# Altium footprint library Connectors.PcbLib: 79 footprints (part 2 of 5)
Each footprint in its own frame and in the unit in brackets; x right, y up, seen from the top. Pads: shape width x height; smd on the part's side, far side on the other; paste and mask are expansions set on the pad; w line width, h text height; cw(c..) or ccw(c..) is an arc to the next point about the centre after c.
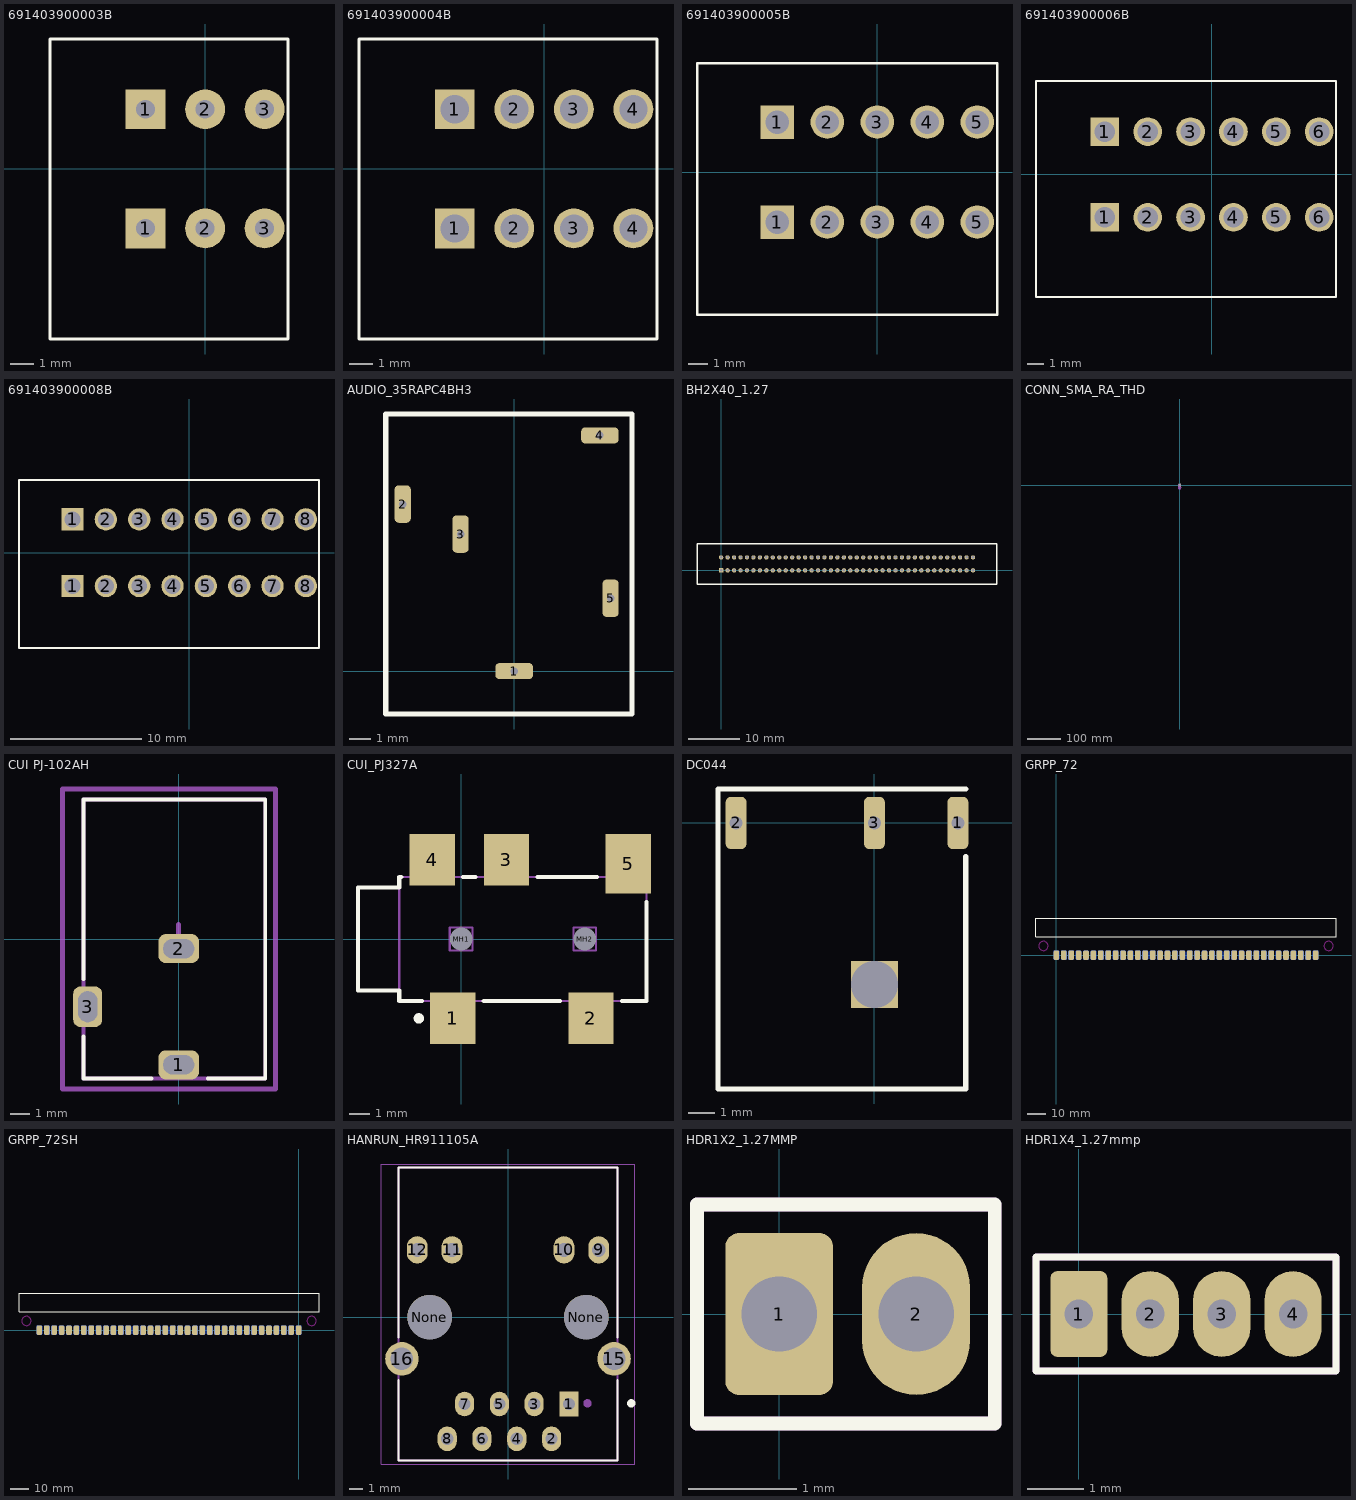
[diagram p1: the footprints below, top view; thin cyan lines are the x and y axes]

## 691403900003B [mm] "2,54mm - Spring clamp/Screwless - Vertical wire entry - 03p"
height 13.6
pads (6):
  rect 1.7x1.7 hole 0.8: 1(-2.54,2.54) 1(-2.54,-2.54)
  round 1.7 hole 0.8: 2(0,-2.54) 2(0,2.54) 3(2.54,-2.54) 3(2.54,2.54)
Top Overlay:
  lines w0.127: -6.62,-7.26 3.54,-7.26 3.54,5.54 -6.62,5.54 -6.62,-7.26
3D body "691403900003B.stp": height 13.61, standoff -3.49, extent -6.62,-7.26 3.54,5.54

## 691403900004B [mm] "2,54mm - Spring clamp/Screwless - Vertical wire entry - 04p"
height 13.6
pads (8):
  rect 1.7x1.7 hole 1.2: 1(-3.81,-2.54) 1(-3.81,2.54)
  round 1.7 hole 1.2: 2(-1.27,-2.54) 2(-1.27,2.54) 3(1.27,-2.54) 3(1.27,2.54) 4(3.81,-2.54) 4(3.81,2.54)
Top Overlay:
  lines w0.127: -7.89,-7.26 -7.89,5.54 4.81,5.54 4.81,-7.26 -7.89,-7.26
3D body "691403900004B.stp": height 13.61, standoff -3.49, extent -7.89,-7.26 4.81,5.54

## 691403900005B [mm] "2,54mm - Spring clamp/Screwless - Vertical wire entry - 05p"
height 13.6
pads (10):
  rect 1.7x1.7 hole 1.2: 1(-5.08,-2.54) 1(-5.08,2.54)
  round 1.7 hole 1.2: 2(-2.54,-2.54) 2(-2.54,2.54) 3(0,-2.54) 3(0,2.54) 4(2.54,-2.54) 4(2.54,2.54) 5(5.08,-2.54) 5(5.08,2.54)
Top Overlay:
  lines w0.127: -9.16,-7.26 -9.16,5.54 6.08,5.54 6.08,-7.26 -9.16,-7.26
3D body "691403900005B.stp": height 13.61, standoff -3.49, extent -9.16,-7.26 6.08,5.54

## 691403900006B [mm] "2,54mm - Spring clamp/Screwless - Vertical wire entry - 06p"
height 13.6
pads (12):
  rect 1.7x1.7 hole 1.2: 1(-6.35,-2.54) 1(-6.35,2.54)
  round 1.7 hole 1.2: 2(-3.81,-2.54) 2(-3.81,2.54) 3(-1.27,-2.54) 3(-1.27,2.54) 4(1.27,-2.54) 4(1.27,2.54) 5(3.81,-2.54) 5(3.81,2.54) 6(6.35,-2.54) 6(6.35,2.54)
Top Overlay:
  lines w0.127: -10.43,-7.26 7.35,-7.26 7.35,5.54 -10.43,5.54 -10.43,-7.26
3D body "691403900006B.stp": height 13.61, standoff -3.49, extent -10.43,-7.26 7.35,5.54

## 691403900008B [mm] "2,54mm - Spring clamp/Screwless - Vertical wire entry - 08p"
height 13.6
pads (16):
  rect 1.7x1.7 hole 1.2: 1(-8.89,-2.54) 1(-8.89,2.54)
  round 1.7 hole 1.2: 2(-6.35,-2.54) 2(-6.35,2.54) 3(-3.81,-2.54) 3(-3.81,2.54) 4(-1.27,-2.54) 4(-1.27,2.54) 5(1.27,-2.54) 5(1.27,2.54) 6(3.81,-2.54) 6(3.81,2.54) 7(6.35,-2.54) 7(6.35,2.54) 8(8.89,-2.54) 8(8.89,2.54)
Top Overlay:
  lines w0.127: -12.97,-7.26 -12.97,5.54 9.89,5.54 9.89,-7.26 -12.97,-7.26
3D body "691403900008B.stp": height 13.61, standoff -3.49, extent -12.97,-7.26 9.89,5.54

## AUDIO_35RAPC4BH3 [mm] "Switchcraft Phone Connectors 3.5MM STEREO JACK"
pads (5):
  rrect50% 1.75x0.75 hole 0.35 square: 1(0,0) 4(4,11)
  rrect50% 0.75x1.75 hole 0.35 square: 2(-5.2,7.8) 3(-2.5,6.4) 5(4.5,3.4)
Top Overlay:
  lines w0.254: -6,-2 -6,12 5.5,12 5.5,-2 -6,-2
3D body "SJ1-3513N.stp": height 6, standoff -3, extent -5.9,-5.5 5.6,12

## BH2X40_1.27 [mm]
pads (80):
  rrect20% 0.85x0.85 hole 0.5: 1(0,0)
  round 0.85 hole 0.5: 2(0,2.54) 3(1.27,0) 4(1.27,2.54) 5(2.54,0) 6(2.54,2.54) 7(3.81,0) 8(3.81,2.54) 9(5.08,0) 10(5.08,2.54) 11(6.35,0) 12(6.35,2.54) 13(7.62,0) 14(7.62,2.54) 15(8.89,0) 16(8.89,2.54) 17(10.16,0) 18(10.16,2.54) 19(11.43,0) 20(11.43,2.54) 21(12.7,0) 22(12.7,2.54) 23(13.97,0) 24(13.97,2.54) 25(15.24,0) 26(15.24,2.54) 27(16.51,0) 28(16.51,2.54) 29(17.78,0) 30(17.78,2.54) 31(19.05,0) 32(19.05,2.54) 33(20.32,0) 34(20.32,2.54) 35(21.59,0) 36(21.59,2.54) 37(22.86,0) 38(22.86,2.54) 39(24.13,0) 40(24.13,2.54) 41(25.4,0) 42(25.4,2.54) 43(26.67,0) 44(26.67,2.54) 45(27.94,0) 46(27.94,2.54) 47(29.21,0) 48(29.21,2.54) 49(30.48,0) 50(30.48,2.54) 51(31.75,0) 52(31.75,2.54) 53(33.02,0) 54(33.02,2.54) 55(34.29,0) 56(34.29,2.54) 57(35.56,0) 58(35.56,2.54) 59(36.83,0) 60(36.83,2.54) 61(38.1,0) 62(38.1,2.54) 63(39.37,0) 64(39.37,2.54) 65(40.64,0) 66(40.64,2.54) 67(41.91,0) 68(41.91,2.54) 69(43.18,0) 70(43.18,2.54) 71(44.45,0) 72(44.45,2.54) 73(45.72,0) 74(45.72,2.54) 75(46.99,0) 76(46.99,2.54) 77(48.26,0) 78(48.26,2.54) 79(49.53,0) 80(49.53,2.54)
Top Overlay:
  lines w0.254: -4.75,-2.75 -4.75,5.25 54.25,5.25 54.25,-2.75 -4.75,-2.75

## CONN_SMA_RA_THD [mm]
height 10.43
pads (5):
  round 2.5 hole 1.5: 1(0,0)
  round 2.5 hole 1.6: 2(-2.54,-2.54) 2(-2.54,2.54) 2(2.54,-2.54) 2(2.54,2.54)
Mechanical 13:
  drawing of 402 lines, arcs and shapes, not listed
3D body "SMA Conn TE 5-1814400-1.STEP": height 10.43, standoff -3.41, extent -3.173,-11.05 3.167,3.15

## CUI PJ-102AH [mm] "DC Barrel Jack W/ Switch 2.0x5.5"
height 11
pads (3):
  rrect50% 2.1x1.5 hole 1 slot 1.6 at 0 deg: 1(0,-6.5) 2(0,-0.5)
  rrect50% 1.5x2.1 hole 1 slot 1.6 at 90 deg: 3(-4.7,-3.5)
Top Overlay:
  lines w0.2: -4.925,-5.025 -4.925,-7.2 -1.4,-7.2 ; -4.925,-2.075 -4.925,7.2 4.475,7.2 4.475,-6.525 4.475,-7.2 1.5,-7.2
Mechanical 1:
  lines w0.2: -4.925,-7.2 -4.925,7.2 4.475,7.2 4.475,-7.2 -4.925,-7.2
Mechanical 15:
  lines w0.254: -0.75,0 0,0 ; 0,-0.75 0,0 ; 0,0.75 0,0 ; 0.75,0 0,0 ; -6,-7.75 -6,-3.5 -6,7.75 5,7.75 5,-7.75 -6,-7.75
3D body "CUI-PJ-102AH.step": height 11, standoff -3.5, extent -4.925,-7.2 4.475,7.2

## CUI_PJ327A [mm] "Phone Jack, Right Angle, SM, Body 14x6x4.8mm (LxWxH)"
height 4.87
pads (7):
  rect 2.2x2.5 smd: 1(-0.4,-3.85) 2(6.3,-3.85) 3(2.2,3.85) 4(-1.4,3.85)
  rect 2.2x2.9 smd: 5(8.1,3.65)
  round 0.8 hole 1.1 unplated: MH1(0,0) MH2(6,0)
Top Overlay:
  circle w0.25: c-2.05,-3.85 r0.125
  lines w0.2: -2.9,3 -3,3 -3,2.5 -5,2.5 -5,-2.5 -3,-2.5 -3,-3 -1.9,-3 ; 0.1,3 0.7,3 ; 1.1,-3 4.8,-3 ; 3.7,3 6.6,3 ; 7.8,-3 9,-3 9,1.8
Mechanical 13:
  lines w0.1: -3,-2.5 -5,-2.5 -5,2.5 -3,2.5 ; -3,-3 -3,3 9,3 9,-3 -3,-3 ; -0.55,-0.55 -0.55,0.55 0.55,0.55 0.55,-0.55 -0.55,-0.55 ; 5.45,-0.55 6.55,-0.55 6.55,0.55 5.45,0.55 5.45,-0.55
3D body "User Library-Micro_Jack_3_5mmTRS.STEP": height 6.3, standoff -1.7, extent -73.3,-4 8.6,4
3D body: height 0.1, standoff -0.4, extent 5.451,-0.549 6.549,0.549
3D body: height 0.1, standoff -0.4, extent -0.549,-0.549 0.549,0.549
3D body: height 4.8, standoff -0.2, extent -4.999,-2.497 -2.999,2.497
3D body: height 4.77, standoff 0, extent -2.999,-2.999 9,3

## DC044 [mm]
pads (4):
  rrect50% 0.8x2 hole 0.5 square: 1(3.2,0) 2(-5.3,0) 3(0,0)
  rect 1.8x1.8 hole 1.8 square unplated: ""(0,-6.2)
Top Overlay:
  lines w0.2: 3.5,-1.3 3.5,-10.2 3.2,-10.2 -6,-10.2 -6,1.3 3.5,1.3
3D body "DC044 (2).step": height 7, standoff -2.7, extent -6.05,-10.2 3.45,1.3

## GRPP_72 [mm] "Разъем ГРПП-72"
pads (72):
  rrect50% 3x5 smd: 1(0,0) 2(4,0) 3(8,0) 4(12,0) 5(16,0) 6(20,0) 7(24,0) 8(28,0) 9(32,0) 10(36,0) 11(40,0) 12(44,0) 13(48,0) 14(52,0) 15(56,0) 16(60,0) 17(64,0) 18(68,0) 19(72,0) 20(76,0) 21(80,0) 22(84,0) 23(88,0) 24(92,0) 25(96,0) 26(100,0) 27(104,0) 28(108,0) 29(112,0) 30(116,0) 31(120,0) 32(124,0) 33(128,0) 34(132,0) 35(136,0) 36(140,0)
  rrect50% 3x5 smd far side: 37(0,0) 38(4,0) 39(8,0) 40(12,0) 41(16,0) 42(20,0) 43(24,0) 44(28,0) 45(32,0) 46(36,0) 47(40,0) 48(44,0) 49(48,0) 50(52,0) 51(56,0) 52(60,0) 53(64,0) 54(68,0) 55(72,0) 56(76,0) 57(80,0) 58(84,0) 59(88,0) 60(92,0) 61(96,0) 62(100,0) 63(104,0) 64(108,0) 65(112,0) 66(116,0) 67(120,0) 68(124,0) 69(128,0) 70(132,0) 71(136,0) 72(140,0)
Top Overlay:
  lines w0.254: -11,10 -11,20 151,20 151,10 -11,10
Keep-Out Layer:
  circle w0.254: c-7,5 r2.5
  circle w0.254: c147,5 r2.5

## GRPP_72SH [mm] "Разъем ГРПП-72Ш"
pads (72):
  rrect50% 3x5 smd: 1(0,0) 2(-4,0) 3(-8,0) 4(-12,0) 5(-16,0) 6(-20,0) 7(-24,0) 8(-28,0) 9(-32,0) 10(-36,0) 11(-40,0) 12(-44,0) 13(-48,0) 14(-52,0) 15(-56,0) 16(-60,0) 17(-64,0) 18(-68,0) 19(-72,0) 20(-76,0) 21(-80,0) 22(-84,0) 23(-88,0) 24(-92,0) 25(-96,0) 26(-100,0) 27(-104,0) 28(-108,0) 29(-112,0) 30(-116,0) 31(-120,0) 32(-124,0) 33(-128,0) 34(-132,0) 35(-136,0) 36(-140,0)
  rrect50% 3x5 smd far side: 37(0,0) 38(-4,0) 39(-8,0) 40(-12,0) 41(-16,0) 42(-20,0) 43(-24,0) 44(-28,0) 45(-32,0) 46(-36,0) 47(-40,0) 48(-44,0) 49(-48,0) 50(-52,0) 51(-56,0) 52(-60,0) 53(-64,0) 54(-68,0) 55(-72,0) 56(-76,0) 57(-80,0) 58(-84,0) 59(-88,0) 60(-92,0) 61(-96,0) 62(-100,0) 63(-104,0) 64(-108,0) 65(-112,0) 66(-116,0) 67(-120,0) 68(-124,0) 69(-128,0) 70(-132,0) 71(-136,0) 72(-140,0)
Top Overlay:
  lines w0.254: -151,10 11,10 11,20 -151,20 -151,10
Keep-Out Layer:
  circle w0.254: c7,5 r2.5
  circle w0.254: c-147,5 r2.5

## HANRUN_HR911105A [mm]
pads (16):
  rect 1.398x1.8 hole 0.89: 1(4.45,-6.35)
  oval 1.398x1.8 hole 0.89: 2(3.18,-8.89) 3(1.91,-6.35) 4(0.64,-8.89) 5(-0.63,-6.35) 6(-1.9,-8.89) 7(-3.17,-6.35) 8(-4.44,-8.89)
  oval 1.53x2 hole 1.02: 9(6.625,4.9) 10(4.085,4.9) 11(-4.085,4.9) 12(-6.625,4.9)
  round 2.445 hole 1.63: 15(7.745,-3.05) 16(-7.745,-3.05)
  round 3.25 hole 3.25 unplated: None(-5.715,0) None(5.715,0)
Top Overlay:
  circle w0.3: c9,-6.3 r0.15
  lines w0.127: -8,-4.6 -8,-10.48 8,-10.48 8,-4.6 ; -8,-1.5 -8,10.92 8,10.92 8,-1.5
Mechanical 1:
  circle w0.3: c5.8,-6.3 r0.15
  lines w0.127: -8,-10.48 -8,10.92 8,10.92 8,-10.48 -8,-10.48
Mechanical 4:
  lines w0.05: -9.25,-10.73 -9.25,11.17 9.25,11.17 9.25,-10.73 -9.25,-10.73
3D body "User Library-HR911105A.step": height 13.5, standoff -3, extent -7.93,-10.5 7.95,10.9

## HDR1X2_1.27MMP [mm] "Connector; Header; 2 Position, 0.050\" pitch"
pads (2):
  rrect25% 1x1.5 hole 0.7: 1(0,0)
  oval 1x1.5 hole 0.7: 2(1.27,0)
Top Overlay:
  lines w0.127: -0.762,-1.016 -0.762,1.016 2,1.016 2,-1.016 -0.762,-1.016
Mechanical 13:
  lines w0.127: -0.762,-1.016 -0.762,1.016 2,1.016 2,1 2,-1.016 -0.762,-1.016

## HDR1X4_1.27mmp [mil] "Connector; Header; 4 Position, 0.050\" pitch"
pads (4):
  rrect25% 40x60 hole 20: 1(0,0)
  oval 40x60 hole 20: 2(50,0) 3(100,0) 4(150,0)
Top Overlay:
  lines w5: -30,-40 -30,40 180,40 180,-40 -30,-40
Mechanical 13:
  lines w5: -30,-40 -30,40 180,40 180,-40 -30,-40